# Altium footprint library IC.PcbLib: 386 footprints (part 4 of 30) (continued)
## BGA196_0.8(12X12) [mm] (continued)
Top Overlay:
  circle w0.25: c-6.625,5.875 r0.125
  region: -5.223,6.025 -5.975,5.274 -5.975,6.025
  lines w0.2: -5.975,5.274 -5.223,6.025 ; -5.975,-5.975 -5.975,6.025 6.025,6.025 6.025,-5.975 -5.975,-5.975
Mechanical 13:
  lines w0.1: -5.975,-5.975 -5.975,6.025 6.025,6.025 6.025,-5.975 -5.975,-5.975
Mechanical 15:
  lines w0.05: -6.475,-6.475 -6.475,6.525 6.525,6.525 6.525,-6.475 -6.475,-6.475
  lines w0.1: -0.475,0.025 0.525,0.025 ; 0.025,-0.475 0.025,0.525
3D body "BGA196C80P14X14_1200X1200X130.step": height 1.3, standoff 0, extent -6.025,-5.975 5.975,6.025

## BGA201_0.65(10X10) [mm]
pads (201):
  round 0.25 smd: A1(-4.549,4.542) A2(-3.899,4.542) A3(-3.249,4.542) A4(-2.599,4.542) A5(-1.949,4.542) A6(-1.299,4.542) A7(-0.649,4.542) A8(0.001,4.542) A9(0.651,4.542) A10(1.301,4.542) A11(1.951,4.542) A12(2.601,4.542) A13(3.251,4.542) A14(3.901,4.542) A15(4.551,4.542) B1(-4.549,3.892) B2(-3.899,3.892) B3(-3.249,3.892) B4(-2.599,3.892) B5(-1.949,3.892) B6(-1.299,3.892) B7(-0.649,3.892) B8(0.001,3.892) B9(0.651,3.892) B10(1.301,3.892) B11(1.951,3.892) B12(2.601,3.892) B13(3.251,3.892) B14(3.901,3.892) B15(4.551,3.892) C1(-4.549,3.242) C2(-3.899,3.242) C3(-3.249,3.242) C4(-2.599,3.242) C5(-1.949,3.242) C6(-1.299,3.242) C7(-0.649,3.242) C8(0.001,3.242) C9(0.651,3.242) C10(1.301,3.242) C11(1.951,3.242) C12(2.601,3.242) C13(3.251,3.242) C14(3.901,3.242) C15(4.551,3.242) D1(-4.549,2.592) D2(-3.899,2.592) D3(-3.249,2.592) D4(-2.599,2.592) D5(-1.949,2.592) D6(-1.299,2.592) D7(-0.649,2.592) D8(0.001,2.592) D9(0.651,2.592) D10(1.301,2.592) D11(1.951,2.592) D12(2.601,2.592) D13(3.251,2.592) D14(3.901,2.592) D15(4.551,2.592) E1(-4.549,1.942) E2(-3.899,1.942) E3(-3.249,1.942) E4(-2.599,1.942) E12(2.601,1.942) E13(3.251,1.942) E14(3.901,1.942) E15(4.551,1.942) F1(-4.549,1.292) F2(-3.899,1.292) F3(-3.249,1.292) F4(-2.599,1.292) F6(-1.299,1.292) F7(-0.649,1.292) F8(0.001,1.292) F9(0.651,1.292) F10(1.301,1.292) F12(2.601,1.292) F13(3.251,1.292) F14(3.901,1.292) F15(4.551,1.292) G1(-4.549,0.642) G2(-3.899,0.642) G3(-3.249,0.642) G4(-2.599,0.642) G6(-1.299,0.642) G7(-0.649,0.642) G8(0.001,0.642) G9(0.651,0.642) G10(1.301,0.642) G12(2.601,0.642) G13(3.251,0.642) G14(3.901,0.642) G15(4.551,0.642) H1(-4.549,-0.008) H2(-3.899,-0.008) H3(-3.249,-0.008) H4(-2.599,-0.008) H6(-1.299,-0.008) H7(-0.649,-0.008) H8(0.001,-0.008) H9(0.651,-0.008) H10(1.301,-0.008) H12(2.601,-0.008) H13(3.251,-0.008) H14(3.901,-0.008) H15(4.551,-0.008) J1(-4.549,-0.658) J2(-3.899,-0.658) J3(-3.249,-0.658) J4(-2.599,-0.658) J6(-1.299,-0.658) J7(-0.649,-0.658) J8(0.001,-0.658) J9(0.651,-0.658) J10(1.301,-0.658) J12(2.601,-0.658) J13(3.251,-0.658) J14(3.901,-0.658) J15(4.551,-0.658) K1(-4.549,-1.308) K2(-3.899,-1.308) K3(-3.249,-1.308) K4(-2.599,-1.308) K6(-1.299,-1.308) K7(-0.649,-1.308) K8(0.001,-1.308) K9(0.651,-1.308) K10(1.301,-1.308) K12(2.601,-1.308) K13(3.251,-1.308) K14(3.901,-1.308) K15(4.551,-1.308) L1(-4.549,-1.958) L2(-3.899,-1.958) L3(-3.249,-1.958) L4(-2.599,-1.958) L12(2.601,-1.958) L13(3.251,-1.958) L14(3.901,-1.958) L15(4.551,-1.958) M1(-4.549,-2.608) M2(-3.899,-2.608) M3(-3.249,-2.608) M4(-2.599,-2.608) M5(-1.949,-2.608) M6(-1.299,-2.608) M7(-0.649,-2.608) M8(0.001,-2.608) M9(0.651,-2.608) M10(1.301,-2.608) M11(1.951,-2.608) M12(2.601,-2.608) M13(3.251,-2.608) M14(3.901,-2.608) M15(4.551,-2.608) N1(-4.549,-3.258) N2(-3.899,-3.258) N3(-3.249,-3.258) N4(-2.599,-3.258) N5(-1.949,-3.258) N6(-1.299,-3.258) N7(-0.649,-3.258) N8(0.001,-3.258) N9(0.651,-3.258) N10(1.301,-3.258) N11(1.951,-3.258) N12(2.601,-3.258) N13(3.251,-3.258) N14(3.901,-3.258) N15(4.551,-3.258) P1(-4.549,-3.908) P2(-3.899,-3.908) P3(-3.249,-3.908) P4(-2.599,-3.908) P5(-1.949,-3.908) P6(-1.299,-3.908) P7(-0.649,-3.908) P8(0.001,-3.908) P9(0.651,-3.908) P10(1.301,-3.908) P11(1.951,-3.908) P12(2.601,-3.908) P13(3.251,-3.908) P14(3.901,-3.908) P15(4.551,-3.908) R1(-4.549,-4.558) R2(-3.899,-4.558) R3(-3.249,-4.558) R4(-2.599,-4.558) R5(-1.949,-4.558) R6(-1.299,-4.558) R7(-0.649,-4.558) R8(0.001,-4.558) R9(0.651,-4.558) R10(1.301,-4.558) R11(1.951,-4.558) R12(2.601,-4.558) R13(3.251,-4.558) R14(3.901,-4.558) R15(4.551,-4.558)
Top Overlay:
  circle w0.25: c-5.424,5.192 r0.125
  region: -4.677,4.992 -4.999,4.67 -4.999,4.992
  lines w0.2: -4.999,-5.008 -4.999,4.992 5.001,4.992 5.001,-5.008 -4.999,-5.008
Mechanical 13:
  lines w0.1: -4.999,-5.008 -4.999,4.992 5.001,4.992 5.001,-5.008 -4.999,-5.008
Mechanical 15:
  lines w0.05: -5.499,-5.508 -5.499,5.492 5.501,5.492 5.501,-5.508 -5.499,-5.508
  lines w0.1: -0.499,-0.008 0.501,-0.008 ; 0.001,-0.508 0.001,0.492
3D body "User Library-UFBGA176+25.STEP": height 0.44, standoff 0, extent -5,-4.996 5,5.004

## BGA216_0.8(13X13) [mm]
pads (216):
  round 0.35 smd: A1(-5.625,5.651) A2(-4.825,5.651) A3(-4.025,5.651) A4(-3.225,5.651) A5(-2.425,5.651) A6(-1.625,5.651) A7(-0.825,5.651) A8(-0.025,5.651) A9(0.775,5.651) A10(1.575,5.651) A11(2.375,5.651) A12(3.175,5.651) A13(3.975,5.651) A14(4.775,5.651) A15(5.575,5.651) B1(-5.625,4.851) B2(-4.825,4.851) B3(-4.025,4.851) B4(-3.225,4.851) B5(-2.425,4.851) B6(-1.625,4.851) B7(-0.825,4.851) B8(-0.025,4.851) B9(0.775,4.851) B10(1.575,4.851) B11(2.375,4.851) B12(3.175,4.851) B13(3.975,4.851) B14(4.775,4.851) B15(5.575,4.851) C1(-5.625,4.051) C2(-4.825,4.051) C3(-4.025,4.051) C4(-3.225,4.051) C5(-2.425,4.051) C6(-1.625,4.051) C7(-0.825,4.051) C8(-0.025,4.051) C9(0.775,4.051) C10(1.575,4.051) C11(2.375,4.051) C12(3.175,4.051) C13(3.975,4.051) C14(4.775,4.051) C15(5.575,4.051) D1(-5.625,3.251) D2(-4.825,3.251) D3(-4.025,3.251) D4(-3.225,3.251) D5(-2.425,3.251) D6(-1.625,3.251) D7(-0.825,3.251) D8(-0.025,3.251) D9(0.775,3.251) D10(1.575,3.251) D11(2.375,3.251) D12(3.175,3.251) D13(3.975,3.251) D14(4.775,3.251) D15(5.575,3.251) E1(-5.625,2.451) E2(-4.825,2.451) E3(-4.025,2.451) E4(-3.225,2.451) E5(-2.425,2.451) E6(-1.625,2.451) E7(-0.825,2.451) E8(-0.025,2.451) E9(0.775,2.451) E10(1.575,2.451) E11(2.375,2.451) E12(3.175,2.451) E13(3.975,2.451) E14(4.775,2.451) E15(5.575,2.451) F1(-5.625,1.651) F2(-4.825,1.651) F3(-4.025,1.651) F4(-3.225,1.651) F5(-2.425,1.651) F6(-1.625,1.651) F7(-0.825,1.651) F8(-0.025,1.651) F9(0.775,1.651) F10(1.575,1.651) F11(2.375,1.651) F12(3.175,1.651) F13(3.975,1.651) F14(4.775,1.651) F15(5.575,1.651) G1(-5.625,0.851) G2(-4.825,0.851) G3(-4.025,0.851) G4(-3.225,0.851) G5(-2.425,0.851) G6(-1.625,0.851) G10(1.575,0.851) G11(2.375,0.851) G12(3.175,0.851) G13(3.975,0.851) G14(4.775,0.851) G15(5.575,0.851) H1(-5.625,0.051) H2(-4.825,0.051) H3(-4.025,0.051) H4(-3.225,0.051) H5(-2.425,0.051) H6(-1.625,0.051) H10(1.575,0.051) H11(2.375,0.051) H12(3.175,0.051) H13(3.975,0.051) H14(4.775,0.051) H15(5.575,0.051) J1(-5.625,-0.749) J2(-4.825,-0.749) J3(-4.025,-0.749) J4(-3.225,-0.749) J5(-2.425,-0.749) J6(-1.625,-0.749) J10(1.575,-0.749) J11(2.375,-0.749) J12(3.175,-0.749) J13(3.975,-0.749) J14(4.775,-0.749) J15(5.575,-0.749) K1(-5.625,-1.549) K2(-4.825,-1.549) K3(-4.025,-1.549) K4(-3.225,-1.549) K5(-2.425,-1.549) K6(-1.625,-1.549) K7(-0.825,-1.549) K8(-0.025,-1.549) K9(0.775,-1.549) K10(1.575,-1.549) K11(2.375,-1.549) K12(3.175,-1.549) K13(3.975,-1.549) K14(4.775,-1.549) K15(5.575,-1.549) L1(-5.625,-2.349) L2(-4.825,-2.349) L3(-4.025,-2.349) L4(-3.225,-2.349) L5(-2.425,-2.349) L6(-1.625,-2.349) L7(-0.825,-2.349) L8(-0.025,-2.349) L9(0.775,-2.349) L10(1.575,-2.349) L11(2.375,-2.349) L12(3.175,-2.349) L13(3.975,-2.349) L14(4.775,-2.349) L15(5.575,-2.349) M1(-5.625,-3.149) M2(-4.825,-3.149) M3(-4.025,-3.149) M4(-3.225,-3.149) M5(-2.425,-3.149) M6(-1.625,-3.149) M7(-0.825,-3.149) M8(-0.025,-3.149) M9(0.775,-3.149) M10(1.575,-3.149) M11(2.375,-3.149) M12(3.175,-3.149) M13(3.975,-3.149) M14(4.775,-3.149) M15(5.575,-3.149) N1(-5.625,-3.949) N2(-4.825,-3.949) N3(-4.025,-3.949) N4(-3.225,-3.949) N5(-2.425,-3.949) N6(-1.625,-3.949) N7(-0.825,-3.949) N8(-0.025,-3.949) N9(0.775,-3.949) N10(1.575,-3.949) N11(2.375,-3.949) N12(3.175,-3.949) N13(3.975,-3.949) N14(4.775,-3.949) N15(5.575,-3.949) P1(-5.625,-4.749) P2(-4.825,-4.749) P3(-4.025,-4.749) P4(-3.225,-4.749) P5(-2.425,-4.749) P6(-1.625,-4.749) P7(-0.825,-4.749) P8(-0.025,-4.749) P9(0.775,-4.749) P10(1.575,-4.749) P11(2.375,-4.749) P12(3.175,-4.749) P13(3.975,-4.749) P14(4.775,-4.749) P15(5.575,-4.749) R1(-5.625,-5.549) R2(-4.825,-5.549) R3(-4.025,-5.549) R4(-3.225,-5.549) R5(-2.425,-5.549) R6(-1.625,-5.549) R7(-0.825,-5.549) R8(-0.025,-5.549) R9(0.775,-5.549) R10(1.575,-5.549) R11(2.375,-5.549) R12(3.175,-5.549) R13(3.975,-5.549) R14(4.775,-5.549) R15(5.575,-5.549)
Top Overlay:
  circle w0.25: c-7.175,6.401 r0.125
  region: -5.539,6.551 -6.525,5.564 -6.525,6.551
  lines w0.2: -6.525,5.564 -5.539,6.551 ; -6.525,-6.449 6.475,-6.449 6.475,6.551 -6.525,6.551 -6.525,-6.449
Mechanical 13:
  lines w0.1: -6.525,-6.449 6.475,-6.449 6.475,6.551 -6.525,6.551 -6.525,-6.449
Mechanical 15:
  lines w0.05: -7.025,-6.949 6.975,-6.949 6.975,7.051 -7.025,7.051 -7.025,-6.949
  lines w0.1: -0.525,0.051 0.475,0.051 ; -0.025,-0.449 -0.025,0.551
3D body "User Library-TFBGA216.STEP": height 1.04, standoff -0.06, extent -6.551,-6.452 6.449,6.548

## BGA217_0.8(15X15) [mm]
pads (217):
  round 0.43 smd mask-0.065: A1(-6.349,6.375) A2(-5.549,6.375) A3(-4.749,6.375) A4(-3.949,6.375) A5(-3.149,6.375) A6(-2.349,6.375) A7(-1.549,6.375) A8(-0.749,6.375) A9(0.051,6.375) A10(0.851,6.375) A11(1.651,6.375) A12(2.451,6.375) A13(3.251,6.375) A14(4.051,6.375) A15(4.851,6.375) A16(5.651,6.375) A17(6.451,6.375) B1(-6.349,5.575) B2(-5.549,5.575) B3(-4.749,5.575) B4(-3.949,5.575) B5(-3.149,5.575) B6(-2.349,5.575) B7(-1.549,5.575) B8(-0.749,5.575) B9(0.051,5.575) B10(0.851,5.575) B11(1.651,5.575) B12(2.451,5.575) B13(3.251,5.575) B14(4.051,5.575) B15(4.851,5.575) B16(5.651,5.575) B17(6.451,5.575) C1(-6.349,4.775) C2(-5.549,4.775) C3(-4.749,4.775) C4(-3.949,4.775) C5(-3.149,4.775) C6(-2.349,4.775) C7(-1.549,4.775) C8(-0.749,4.775) C9(0.051,4.775) C10(0.851,4.775) C11(1.651,4.775) C12(2.451,4.775) C13(3.251,4.775) C14(4.051,4.775) C15(4.851,4.775) C16(5.651,4.775) C17(6.451,4.775) D1(-6.349,3.975) D2(-5.549,3.975) D3(-4.749,3.975) D4(-3.949,3.975) D5(-3.149,3.975) D6(-2.349,3.975) D7(-1.549,3.975) D8(-0.749,3.975) D9(0.051,3.975) D10(0.851,3.975) D11(1.651,3.975) D12(2.451,3.975) D13(3.251,3.975) D14(4.051,3.975) D15(4.851,3.975) D16(5.651,3.975) D17(6.451,3.975) E1(-6.349,3.175) E2(-5.549,3.175) E3(-4.749,3.175) E4(-3.949,3.175) E14(4.051,3.175) E15(4.851,3.175) E16(5.651,3.175) E17(6.451,3.175) F1(-6.349,2.375) F2(-5.549,2.375) F3(-4.749,2.375) F4(-3.949,2.375) F14(4.051,2.375) F15(4.851,2.375) F16(5.651,2.375) F17(6.451,2.375) G1(-6.349,1.575) G2(-5.549,1.575) G3(-4.749,1.575) G4(-3.949,1.575) G14(4.051,1.575) G15(4.851,1.575) G16(5.651,1.575) G17(6.451,1.575) H1(-6.349,0.775) H2(-5.549,0.775) H3(-4.749,0.775) H4(-3.949,0.775) H8(-0.749,0.775) H9(0.051,0.775) H10(0.851,0.775) H14(4.051,0.775) H15(4.851,0.775) H16(5.651,0.775) H17(6.451,0.775) J1(-6.349,-0.025) J2(-5.549,-0.025) J3(-4.749,-0.025) J4(-3.949,-0.025) J8(-0.749,-0.025) J9(0.051,-0.025) J10(0.851,-0.025) J14(4.051,-0.025) J15(4.851,-0.025) J16(5.651,-0.025) J17(6.451,-0.025) K1(-6.349,-0.825) K2(-5.549,-0.825) K3(-4.749,-0.825) K4(-3.949,-0.825) K8(-0.749,-0.825) K9(0.051,-0.825) K10(0.851,-0.825) K14(4.051,-0.825) K15(4.851,-0.825) K16(5.651,-0.825) K17(6.451,-0.825) L1(-6.349,-1.625) L2(-5.549,-1.625) L3(-4.749,-1.625) L4(-3.949,-1.625) L14(4.051,-1.625) L15(4.851,-1.625) L16(5.651,-1.625) L17(6.451,-1.625) M1(-6.349,-2.425) M2(-5.549,-2.425) M3(-4.749,-2.425) M4(-3.949,-2.425) M14(4.051,-2.425) M15(4.851,-2.425) M16(5.651,-2.425) M17(6.451,-2.425) N1(-6.349,-3.225) N2(-5.549,-3.225) N3(-4.749,-3.225) N4(-3.949,-3.225) N14(4.051,-3.225) N15(4.851,-3.225) N16(5.651,-3.225) N17(6.451,-3.225) P1(-6.349,-4.025) P2(-5.549,-4.025) P3(-4.749,-4.025) P4(-3.949,-4.025) P5(-3.149,-4.025) P6(-2.349,-4.025) P7(-1.549,-4.025) P8(-0.749,-4.025) P9(0.051,-4.025) P10(0.851,-4.025) P11(1.651,-4.025) P12(2.451,-4.025) P13(3.251,-4.025) P14(4.051,-4.025) P15(4.851,-4.025) P16(5.651,-4.025) P17(6.451,-4.025) R1(-6.349,-4.825) R2(-5.549,-4.825) R3(-4.749,-4.825) R4(-3.949,-4.825) R5(-3.149,-4.825) R6(-2.349,-4.825) R7(-1.549,-4.825) R8(-0.749,-4.825) R9(0.051,-4.825) R10(0.851,-4.825) R11(1.651,-4.825) R12(2.451,-4.825) R13(3.251,-4.825) R14(4.051,-4.825) R15(4.851,-4.825) R16(5.651,-4.825) R17(6.451,-4.825) T1(-6.349,-5.625) T2(-5.549,-5.625) T3(-4.749,-5.625) T4(-3.949,-5.625) T5(-3.149,-5.625) T6(-2.349,-5.625) T7(-1.549,-5.625) T8(-0.749,-5.625) T9(0.051,-5.625) T10(0.851,-5.625) T11(1.651,-5.625) T12(2.451,-5.625) T13(3.251,-5.625) T14(4.051,-5.625) T15(4.851,-5.625) T16(5.651,-5.625) T17(6.451,-5.625) U1(-6.349,-6.425) U2(-5.549,-6.425) U3(-4.749,-6.425) U4(-3.949,-6.425) U5(-3.149,-6.425) U6(-2.349,-6.425) U7(-1.549,-6.425) U8(-0.749,-6.425) U9(0.051,-6.425) U10(0.851,-6.425) U11(1.651,-6.425) U12(2.451,-6.425) U13(3.251,-6.425) U14(4.051,-6.425) U15(4.851,-6.425) U16(5.651,-6.425) U17(6.451,-6.425)
Top Overlay:
  circle w0.25: c-8.099,7.325 r0.125
  region: -6.449,7.475 -7.449,6.475 -7.449,7.475
  lines w0.2: -7.449,6.475 -6.449,7.475 ; -7.449,-7.525 -7.449,7.475 7.551,7.475 7.551,-7.525 -7.449,-7.525
Mechanical 13:
  lines w0.1: -7.449,-7.525 -7.449,7.475 7.551,7.475 7.551,-7.525 -7.449,-7.525
Mechanical 15:
  lines w0.05: -8.449,-8.525 -8.449,8.475 8.551,8.475 8.551,-8.525 -8.449,-8.525
  lines w0.1: -0.449,-0.025 0.551,-0.025 ; 0.051,-0.525 0.051,0.475
3D body "User Library-BGA(LFBGA)-217.STEP": height 1.6, standoff 0.01, extent -7.442,-7.525 7.558,7.475

## BGA225_0.8(13x13) [mm]
pads (225):
  round 0.36 smd: A1(-5.6,5.549) A2(-4.8,5.549) A3(-4,5.549) A4(-3.2,5.549) A5(-2.4,5.549) A6(-1.6,5.549) A7(-0.8,5.549) A8(0,5.549) A9(0.8,5.549) A10(1.6,5.549) A11(2.4,5.549) A12(3.2,5.549) A13(4,5.549) A14(4.8,5.549) A15(5.6,5.549) B1(-5.6,4.749) B2(-4.8,4.749) B3(-4,4.749) B4(-3.2,4.749) B5(-2.4,4.749) B6(-1.6,4.749) B7(-0.8,4.749) B8(0,4.749) B9(0.8,4.749) B10(1.6,4.749) B11(2.4,4.749) B12(3.2,4.749) B13(4,4.749) B14(4.8,4.749) B15(5.6,4.749) C1(-5.6,3.949) C2(-4.8,3.949) C3(-4,3.949) C4(-3.2,3.949) C5(-2.4,3.949) C6(-1.6,3.949) C7(-0.8,3.949) C8(0,3.949) C9(0.8,3.949) C10(1.6,3.949) C11(2.4,3.949) C12(3.2,3.949) C13(4,3.949) C14(4.8,3.949) C15(5.6,3.949) D1(-5.6,3.149) D2(-4.8,3.149) D3(-4,3.149) D4(-3.2,3.149) D5(-2.4,3.149) D6(-1.6,3.149) D7(-0.8,3.149) D8(0,3.149) D9(0.8,3.149) D10(1.6,3.149) D11(2.4,3.149) D12(3.2,3.149) D13(4,3.149) D14(4.8,3.149) D15(5.6,3.149) E1(-5.6,2.349) E2(-4.8,2.349) E3(-4,2.349) E4(-3.2,2.349) E5(-2.4,2.349) E6(-1.6,2.349) E7(-0.8,2.349) E8(0,2.349) E9(0.8,2.349) E10(1.6,2.349) E11(2.4,2.349) E12(3.2,2.349) E13(4,2.349) E14(4.8,2.349) E15(5.6,2.349) F1(-5.6,1.549) F2(-4.8,1.549) F3(-4,1.549) F4(-3.2,1.549) F5(-2.4,1.549) F6(-1.6,1.549) F7(-0.8,1.549) F8(0,1.549) F9(0.8,1.549) F10(1.6,1.549) F11(2.4,1.549) F12(3.2,1.549) F13(4,1.549) F14(4.8,1.549) F15(5.6,1.549) G1(-5.6,0.749) G2(-4.8,0.749) G3(-4,0.749) G4(-3.2,0.749) G5(-2.4,0.749) G6(-1.6,0.749) G7(-0.8,0.749) G8(0,0.749) G9(0.8,0.749) G10(1.6,0.749) G11(2.4,0.749) G12(3.2,0.749) G13(4,0.749) G14(4.8,0.749) G15(5.6,0.749) H1(-5.6,-0.051) H2(-4.8,-0.051) H3(-4,-0.051) H4(-3.2,-0.051) H5(-2.4,-0.051) H6(-1.6,-0.051) H7(-0.8,-0.051) H8(0,-0.051) H9(0.8,-0.051) H10(1.6,-0.051) H11(2.4,-0.051) H12(3.2,-0.051) H13(4,-0.051) H14(4.8,-0.051) H15(5.6,-0.051) J1(-5.6,-0.851) J2(-4.8,-0.851) J3(-4,-0.851) J4(-3.2,-0.851) J5(-2.4,-0.851) J6(-1.6,-0.851) J7(-0.8,-0.851) J8(0,-0.851) J9(0.8,-0.851) J10(1.6,-0.851) J11(2.4,-0.851) J12(3.2,-0.851) J13(4,-0.851) J14(4.8,-0.851) J15(5.6,-0.851) K1(-5.6,-1.651) K2(-4.8,-1.651) K3(-4,-1.651) K4(-3.2,-1.651) K5(-2.4,-1.651) K6(-1.6,-1.651) K7(-0.8,-1.651) K8(0,-1.651) K9(0.8,-1.651) K10(1.6,-1.651) K11(2.4,-1.651) K12(3.2,-1.651) K13(4,-1.651) K14(4.8,-1.651) K15(5.6,-1.651) L1(-5.6,-2.451) L2(-4.8,-2.451) L3(-4,-2.451) L4(-3.2,-2.451) L5(-2.4,-2.451) L6(-1.6,-2.451) L7(-0.8,-2.451) L8(0,-2.451) L9(0.8,-2.451) L10(1.6,-2.451) L11(2.4,-2.451) L12(3.2,-2.451) L13(4,-2.451) L14(4.8,-2.451) L15(5.6,-2.451) M1(-5.6,-3.251) M2(-4.8,-3.251) M3(-4,-3.251) M4(-3.2,-3.251) M5(-2.4,-3.251) M6(-1.6,-3.251) M7(-0.8,-3.251) M8(0,-3.251) M9(0.8,-3.251) M10(1.6,-3.251) M11(2.4,-3.251) M12(3.2,-3.251) M13(4,-3.251) M14(4.8,-3.251) M15(5.6,-3.251) N1(-5.6,-4.051) N2(-4.8,-4.051) N3(-4,-4.051) N4(-3.2,-4.051) N5(-2.4,-4.051) N6(-1.6,-4.051) N7(-0.8,-4.051) N8(0,-4.051) N9(0.8,-4.051) N10(1.6,-4.051) N11(2.4,-4.051) N12(3.2,-4.051) N13(4,-4.051) N14(4.8,-4.051) N15(5.6,-4.051) P1(-5.6,-4.851) P2(-4.8,-4.851) P3(-4,-4.851) P4(-3.2,-4.851) P5(-2.4,-4.851) P6(-1.6,-4.851) P7(-0.8,-4.851) P8(0,-4.851) P9(0.8,-4.851) P10(1.6,-4.851) P11(2.4,-4.851) P12(3.2,-4.851) P13(4,-4.851) P14(4.8,-4.851) P15(5.6,-4.851) R1(-5.6,-5.651) R2(-4.8,-5.651) R3(-4,-5.651) R4(-3.2,-5.651) R5(-2.4,-5.651) R6(-1.6,-5.651) R7(-0.8,-5.651) R8(0,-5.651) R9(0.8,-5.651) R10(1.6,-5.651) R11(2.4,-5.651) R12(3.2,-5.651) R13(4,-5.651) R14(4.8,-5.651) R15(5.6,-5.651)
Top Overlay:
  circle w0.25: c-7.15,6.299 r0.125
  region: -5.52,6.449 -6.5,5.469 -6.5,6.449
  lines w0.2: -6.5,5.469 -5.52,6.449 ; -6.5,-6.551 6.5,-6.551 6.5,6.449 -6.5,6.449 -6.5,-6.551
Mechanical 13:
  lines w0.1: -6.5,-6.551 6.5,-6.551 6.5,6.449 -6.5,6.449 -6.5,-6.551
Mechanical 15:
  lines w0.05: -7.5,-7.551 7.5,-7.551 7.5,7.449 -7.5,7.449 -7.5,-7.551
  lines w0.1: -0.5,-0.051 0.5,-0.051 ; 0,-0.551 0,0.449
3D body "BGA225C80P15X15_1300X1300X130.step": height 1.3, standoff 0, extent -6.5,-6.551 6.5,6.449

## BGA238_0.5(10x10) [mm]
height 1
pads (238):
  round 0.25 smd: A1(-4.5,4.449) A2(-4,4.449) A3(-3.5,4.449) A4(-3,4.449) A5(-2.5,4.449) A6(-2,4.449) A7(-1.5,4.449) A8(-1,4.449) A9(-0.5,4.449) A10(0,4.449) A11(0.5,4.449) A12(1,4.449) A13(1.5,4.449) A14(2,4.449) A15(2.5,4.449) A16(3,4.449) A17(3.5,4.449) A18(4,4.449) A19(4.5,4.449) B1(-4.5,3.949) B2(-4,3.949) B3(-3.5,3.949) B4(-3,3.949) B5(-2.5,3.949) B6(-2,3.949) B7(-1.5,3.949) B8(-1,3.949) B9(-0.5,3.949) B10(0,3.949) B11(0.5,3.949) B12(1,3.949) B13(1.5,3.949) B14(2,3.949) B15(2.5,3.949) B16(3,3.949) B17(3.5,3.949) B18(4,3.949) B19(4.5,3.949) C1(-4.5,3.449) C2(-4,3.449) C3(-3.5,3.449) C4(-3,3.449) C5(-2.5,3.449) C6(-2,3.449) C7(-1.5,3.449) C8(-1,3.449) C9(-0.5,3.449) C10(0,3.449) C11(0.5,3.449) C12(1,3.449) C13(1.5,3.449) C14(2,3.449) C15(2.5,3.449) C16(3,3.449) C17(3.5,3.449) C18(4,3.449) C19(4.5,3.449) D1(-4.5,2.949) D2(-4,2.949) D3(-3.5,2.949) D17(3.5,2.949) D18(4,2.949) D19(4.5,2.949) E1(-4.5,2.449) E2(-4,2.449) E3(-3.5,2.449) E17(3.5,2.449) E18(4,2.449) E19(4.5,2.449) F1(-4.5,1.949) F2(-4,1.949) F3(-3.5,1.949) F17(3.5,1.949) F18(4,1.949) F19(4.5,1.949) G1(-4.5,1.449) G2(-4,1.449) G3(-3.5,1.449) G7(-1.5,1.449) G8(-1,1.449) G9(-0.5,1.449) G10(0,1.449) G11(0.5,1.449) G12(1,1.449) G13(1.5,1.449) G17(3.5,1.449) G18(4,1.449) G19(4.5,1.449) H1(-4.5,0.949) H2(-4,0.949) H3(-3.5,0.949) H7(-1.5,0.949) H8(-1,0.949) H9(-0.5,0.949) H10(0,0.949) H11(0.5,0.949) H12(1,0.949) H13(1.5,0.949) H17(3.5,0.949) H18(4,0.949) H19(4.5,0.949) J1(-4.5,0.449) J2(-4,0.449) J3(-3.5,0.449) J7(-1.5,0.449) J8(-1,0.449) J9(-0.5,0.449) J10(0,0.449) J11(0.5,0.449) J12(1,0.449) J13(1.5,0.449) J17(3.5,0.449) J18(4,0.449) J19(4.5,0.449) K1(-4.5,-0.051) K2(-4,-0.051) K3(-3.5,-0.051) K7(-1.5,-0.051) K8(-1,-0.051) K12(1,-0.051) K13(1.5,-0.051) K17(3.5,-0.051) K18(4,-0.051) K19(4.5,-0.051) L1(-4.5,-0.551) L2(-4,-0.551) L3(-3.5,-0.551) L7(-1.5,-0.551) L8(-1,-0.551) L9(-0.5,-0.551) L10(0,-0.551) L11(0.5,-0.551) L12(1,-0.551) L13(1.5,-0.551) L17(3.5,-0.551) L18(4,-0.551) L19(4.5,-0.551) M1(-4.5,-1.051) M2(-4,-1.051) M3(-3.5,-1.051) M7(-1.5,-1.051) M8(-1,-1.051) M9(-0.5,-1.051) M10(0,-1.051) M11(0.5,-1.051) M12(1,-1.051) M13(1.5,-1.051) M17(3.5,-1.051) M18(4,-1.051) M19(4.5,-1.051) N1(-4.5,-1.551) N2(-4,-1.551) N3(-3.5,-1.551) N7(-1.5,-1.551) N8(-1,-1.551) N9(-0.5,-1.551) N10(0,-1.551) N11(0.5,-1.551) N12(1,-1.551) N13(1.5,-1.551) N17(3.5,-1.551) N18(4,-1.551) N19(4.5,-1.551) P1(-4.5,-2.051) P2(-4,-2.051) P3(-3.5,-2.051) P17(3.5,-2.051) P18(4,-2.051) P19(4.5,-2.051) R1(-4.5,-2.551) R2(-4,-2.551) R3(-3.5,-2.551) R17(3.5,-2.551) R18(4,-2.551) R19(4.5,-2.551) T1(-4.5,-3.051) T2(-4,-3.051) T3(-3.5,-3.051) T17(3.5,-3.051) T18(4,-3.051) T19(4.5,-3.051) U1(-4.5,-3.551) U2(-4,-3.551) U3(-3.5,-3.551) U4(-3,-3.551) U5(-2.5,-3.551) U6(-2,-3.551) U7(-1.5,-3.551) U8(-1,-3.551) U9(-0.5,-3.551) U10(0,-3.551) U11(0.5,-3.551) U12(1,-3.551) U13(1.5,-3.551) U14(2,-3.551) U15(2.5,-3.551) U16(3,-3.551) U17(3.5,-3.551) U18(4,-3.551) U19(4.5,-3.551) V1(-4.5,-4.051) V2(-4,-4.051) V3(-3.5,-4.051) V4(-3,-4.051) V5(-2.5,-4.051) V6(-2,-4.051) V7(-1.5,-4.051) V8(-1,-4.051) V9(-0.5,-4.051) V10(0,-4.051) V11(0.5,-4.051) V12(1,-4.051) V13(1.5,-4.051) V14(2,-4.051) V15(2.5,-4.051) V16(3,-4.051) V17(3.5,-4.051) V18(4,-4.051) V19(4.5,-4.051) W1(-4.5,-4.551) W2(-4,-4.551) W3(-3.5,-4.551) W4(-3,-4.551) W5(-2.5,-4.551) W6(-2,-4.551) W7(-1.5,-4.551) W8(-1,-4.551) W9(-0.5,-4.551) W10(0,-4.551) W11(0.5,-4.551) W12(1,-4.551) W13(1.5,-4.551) W14(2,-4.551) W15(2.5,-4.551) W16(3,-4.551) W17(3.5,-4.551) W18(4,-4.551) W19(4.5,-4.551)
Top Overlay:
  circle w0.25: c-5.65,4.799 r0.125
  region: -4.742,4.949 -5,4.692 -5,4.949
  lines w0.2: -5,4.692 -4.742,4.949 ; -5,-5.051 5,-5.051 5,4.949 -5,4.949 -5,-5.051
Mechanical 13:
  lines w0.1: -5,-5.051 5,-5.051 5,4.949 -5,4.949 -5,-5.051
Mechanical 15:
  lines w0.05: -5.25,-5.301 5.25,-5.301 5.25,5.199 -5.25,5.199 -5.25,-5.301
  lines w0.1: -0.5,-0.051 0.5,-0.051 ; 0,-0.551 0,0.449
3D body: height 1.4, standoff 0.2, extent -4.511,3.563 -3.715,4.362
3D body: height 1.38, standoff 0.17, extent -5,-5.051 5,4.949

## BGA247_0.5(10X10) [mm] "BGA, 247-Leads, Body 10x10mm, Pitch 0.5mm, Solder Mask Defined Pads"
height 1.37
pads (247):
  round 0.35 smd mask-0.04: A1(-4.5,4.5) A2(-4,4.5) A12(1,4.5) A14(2,4.5) A16(3,4.5) A18(4,4.5) A19(4.5,4.5) B1(-4.5,4) B2(-4,4) B3(-3.5,4) B4(-3,4) B5(-2.5,4) B6(-2,4) B7(-1.5,4) B8(-1,4) B9(-0.5,4) B10(0,4) B11(0.5,4) B13(1.5,4) B15(2.5,4) B17(3.5,4) B19(4.5,4) C2(-4,3.5) C3(-3.5,3.5) C4(-3,3.5) C5(-2.5,3.5) C6(-2,3.5) C7(-1.5,3.5) C8(-1,3.5) C9(-0.5,3.5) C10(0,3.5) C11(0.5,3.5) C12(1,3.5) C14(2,3.5) C16(3,3.5) C18(4,3.5) D2(-4,3) D3(-3.5,3) D13(1.5,3) D15(2.5,3) D17(3.5,3) D19(4.5,3) E2(-4,2.5) E3(-3.5,2.5) E5(-2.5,2.5) E6(-2,2.5) E7(-1.5,2.5) E8(-1,2.5) E9(-0.5,2.5) E10(0,2.5) E11(0.5,2.5) E12(1,2.5) E13(1.5,2.5) E14(2,2.5) E15(2.5,2.5) E16(3,2.5) E18(4,2.5) E19(4.5,2.5) F2(-4,2) F3(-3.5,2) F5(-2.5,2) F6(-2,2) F7(-1.5,2) F8(-1,2) F9(-0.5,2) F10(0,2) F11(0.5,2) F12(1,2) F13(1.5,2) F14(2,2) F15(2.5,2) F16(3,2) F17(3.5,2) F18(4,2) G2(-4,1.5) G3(-3.5,1.5) G5(-2.5,1.5) G6(-2,1.5) G8(-1,1.5) G9(-0.5,1.5) G10(0,1.5) G11(0.5,1.5) G12(1,1.5) G14(2,1.5) G15(2.5,1.5) G17(3.5,1.5) G18(4,1.5) H2(-4,1) H3(-3.5,1) H5(-2.5,1) H6(-2,1) H7(-1.5,1) H8(-1,1) H9(-0.5,1) H10(0,1) H11(0.5,1) H12(1,1) H13(1.5,1) H14(2,1) H15(2.5,1) H17(3.5,1) H18(4,1) J2(-4,0.5) J3(-3.5,0.5) J5(-2.5,0.5) J6(-2,0.5) J7(-1.5,0.5) J8(-1,0.5) J9(-0.5,0.5) J10(0,0.5) J11(0.5,0.5) J12(1,0.5) J13(1.5,0.5) J14(2,0.5) J15(2.5,0.5) J17(3.5,0.5) J18(4,0.5) K2(-4,0) K3(-3.5,0) K5(-2.5,0) K6(-2,0) K7(-1.5,0) K8(-1,0) K9(-0.5,0) K10(0,0) K11(0.5,0) K12(1,0) K13(1.5,0) K14(2,0) K15(2.5,0) K17(3.5,0) K18(4,0) L2(-4,-0.5) L3(-3.5,-0.5) L5(-2.5,-0.5) L6(-2,-0.5) L7(-1.5,-0.5) L8(-1,-0.5) L9(-0.5,-0.5) L10(0,-0.5) L11(0.5,-0.5) L12(1,-0.5) L13(1.5,-0.5) L14(2,-0.5) L15(2.5,-0.5) L17(3.5,-0.5) L18(4,-0.5) M2(-4,-1) M3(-3.5,-1) M5(-2.5,-1) M6(-2,-1) M7(-1.5,-1) M8(-1,-1) M9(-0.5,-1) M10(0,-1) M11(0.5,-1) M12(1,-1) M13(1.5,-1) M14(2,-1) M15(2.5,-1) M17(3.5,-1) M18(4,-1) N2(-4,-1.5) N3(-3.5,-1.5) N5(-2.5,-1.5) N6(-2,-1.5) N8(-1,-1.5) N11(0.5,-1.5) N12(1,-1.5) N14(2,-1.5) N15(2.5,-1.5) N17(3.5,-1.5) N18(4,-1.5) P2(-4,-2) P3(-3.5,-2) P5(-2.5,-2) P6(-2,-2) P7(-1.5,-2) P8(-1,-2) P9(-0.5,-2) P10(0,-2) P11(0.5,-2) P12(1,-2) P13(1.5,-2) P14(2,-2) P15(2.5,-2) P17(3.5,-2) P18(4,-2) R2(-4,-2.5) R3(-3.5,-2.5) R5(-2.5,-2.5) R6(-2,-2.5) R7(-1.5,-2.5) R8(-1,-2.5) R9(-0.5,-2.5) R10(0,-2.5) R11(0.5,-2.5) R12(1,-2.5) R13(1.5,-2.5) R14(2,-2.5) R15(2.5,-2.5) R17(3.5,-2.5) R18(4,-2.5) T2(-4,-3) T3(-3.5,-3) T17(3.5,-3) T18(4,-3) U2(-4,-3.5) U3(-3.5,-3.5) U4(-3,-3.5) U5(-2.5,-3.5) U6(-2,-3.5) U7(-1.5,-3.5) U8(-1,-3.5) U9(-0.5,-3.5) U10(0,-3.5) U11(0.5,-3.5) U12(1,-3.5) U13(1.5,-3.5) U14(2,-3.5) U15(2.5,-3.5) U16(3,-3.5) U17(3.5,-3.5) U18(4,-3.5) V1(-4.5,-4) V2(-4,-4) V3(-3.5,-4) V4(-3,-4) V5(-2.5,-4) V6(-2,-4) V7(-1.5,-4) V8(-1,-4) V9(-0.5,-4) V10(0,-4) V11(0.5,-4) V12(1,-4) V13(1.5,-4) V14(2,-4) V15(2.5,-4) V16(3,-4) V17(3.5,-4) V18(4,-4) V19(4.5,-4) W1(-4.5,-4.5) W2(-4,-4.5) W18(4,-4.5) W19(4.5,-4.5)
Top Overlay:
  circle w0.25: c-5.65,4.85 r0.125
  region: -4.778,5 -5,4.778 -5,5
  lines w0.2: -5,4.778 -4.778,5 ; -5,-5 -5,5 5,5 5,-5 -5,-5
Mechanical 13:
  lines w0.1: -5,-5 -5,5 5,5 5,-5 -5,-5
Mechanical 15:
  lines w0.05: -6,-6 -6,6 6,6 6,-6 -6,-6
  lines w0.1: -0.5,0 0.5,0 ; 0,-0.5 0,0.5
3D body: height 1.4, standoff 0.4, extent -4.511,3.868 -3.715,4.667
3D body: height 1.37, standoff 0, extent -4.999,-4.999 4.999,4.999